# Altium integrated library ALTIUM-PHD_2_54_DUAL_SOCKET_HEADER_6130XX21821.IntLib: 198 symbols (part 2 of 2)
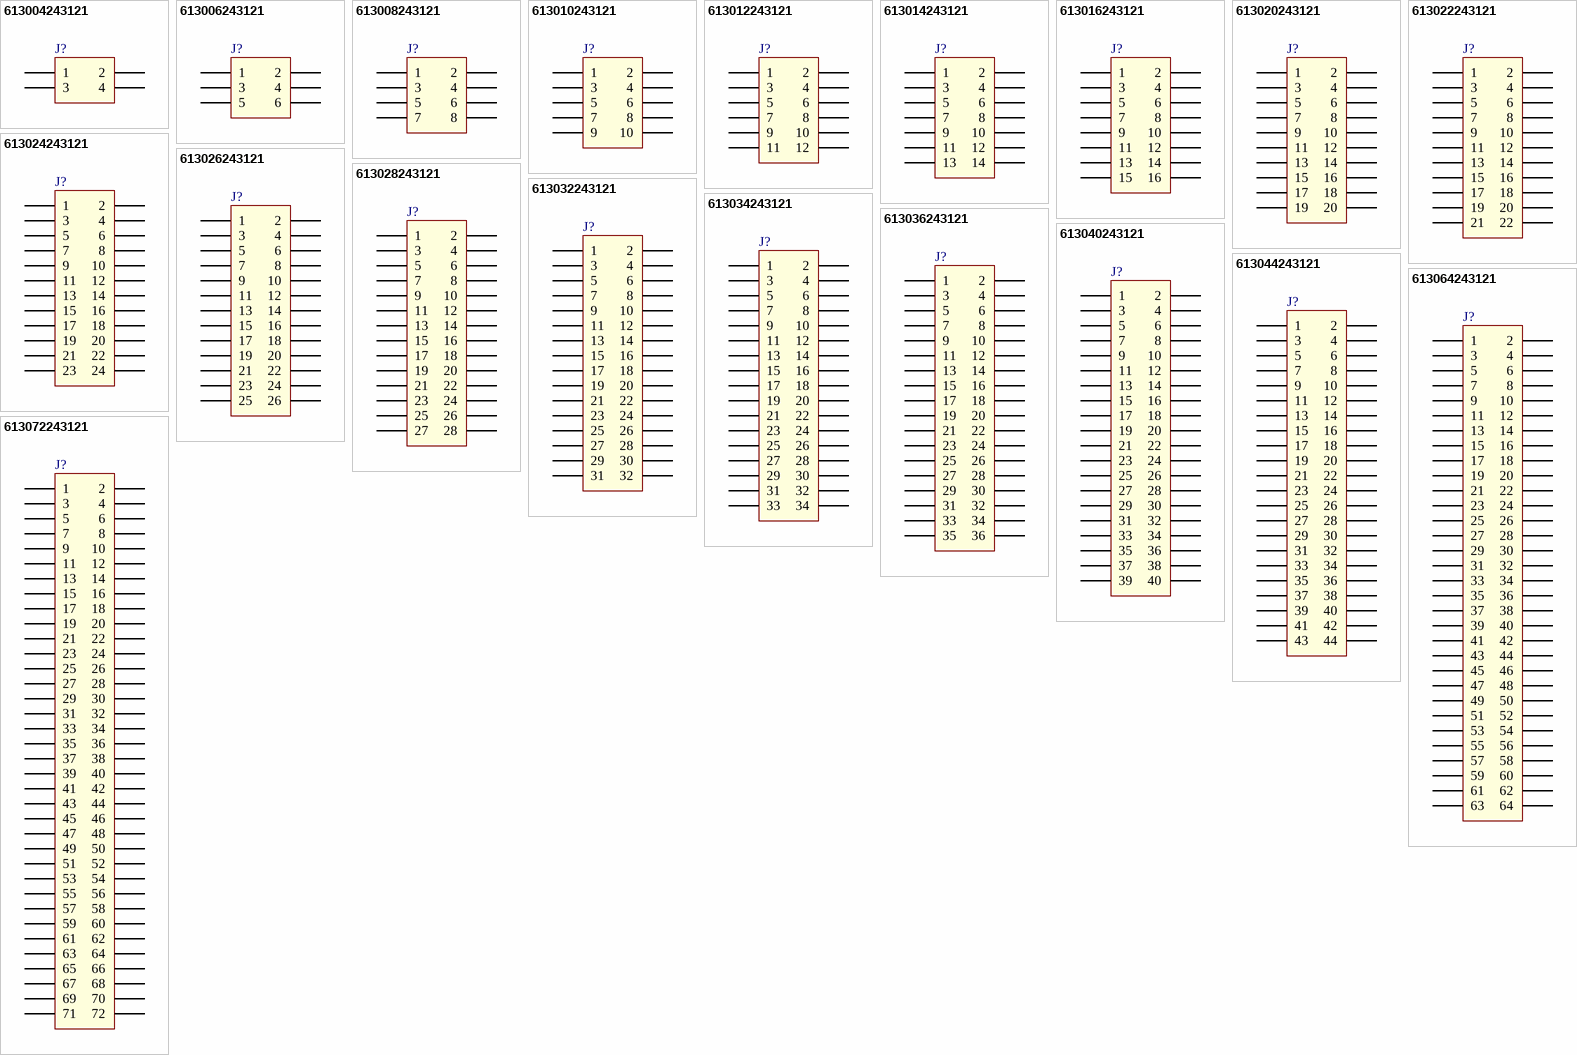
[diagram p14: symbols 613004243121 to 613072243121]

## 613006243121
designator J?
WR-PHD 2.54 mm Angled Dual Socket Header, 6p; Part Number: 613006243121; Pin Number: 6; Rated Current: 3A; Working Voltage: 250V AC; Withstanding Voltage: 500V AC; Pitch: 2.54mm; ComponentLink1Description: Manufacturer; ComponentLink1URL: http://www.we-online.de; ComponentLink2Description: Datasheet; ComponentLink2URL: http://katalog.we-online.de/em/datasheet/6130xx243121.pdf; Published Date: August 2017; Publisher: Wurth Elektronik
footprint 613006243121
pins: 1, 2, 3, 4, 5, 6

## 613008243121
designator J?
WR-PHD 2.54 mm Angled Dual Socket Header, 8p; Part Number: 613008243121; Pin Number: 8; Rated Current: 3A; Working Voltage: 250V AC; Withstanding Voltage: 500V AC; Pitch: 2.54mm; ComponentLink1Description: Manufacturer; ComponentLink1URL: http://www.we-online.de; ComponentLink2Description: Datasheet; ComponentLink2URL: http://katalog.we-online.de/em/datasheet/6130xx243121.pdf; Published Date: August 2017; Publisher: Wurth Elektronik
footprint 613008243121
pins: 1, 2, 3, 4, 5, 6, 7, 8

## 613010243121
designator J?
WR-PHD 2.54 mm Angled Dual Socket Header, 10p; Part Number: 613010243121; Pin Number: 10; Rated Current: 3A; Working Voltage: 250V AC; Withstanding Voltage: 500V AC; Pitch: 2.54mm; ComponentLink1Description: Manufacturer; ComponentLink1URL: http://www.we-online.de; ComponentLink2Description: Datasheet; ComponentLink2URL: http://katalog.we-online.de/em/datasheet/6130xx243121.pdf; Published Date: August 2017; Publisher: Wurth Elektronik
footprint 613010243121
pins: 1, 2, 3, 4, 5, 6, 7, 8, 9, 10

## 613012243121
designator J?
WR-PHD 2.54 mm Angled Dual Socket Header, 12p; Part Number: 613012243121; Pin Number: 12; Rated Current: 3A; Working Voltage: 250V AC; Withstanding Voltage: 500V AC; Pitch: 2.54mm; ComponentLink1Description: Manufacturer; ComponentLink1URL: http://www.we-online.de; ComponentLink2Description: Datasheet; ComponentLink2URL: http://katalog.we-online.de/em/datasheet/6130xx243121.pdf; Published Date: August 2017; Publisher: Wurth Elektronik
footprint 613012243121
pins: 1, 2, 3, 4, 5, 6, 7, 8, 9, 10, 11, 12

## 613014243121
designator J?
WR-PHD 2.54 mm Angled Dual Socket Header, 14p; Part Number: 613014243121; Pin Number: 14; Rated Current: 3A; Working Voltage: 250V AC; Withstanding Voltage: 500V AC; Pitch: 2.54mm; ComponentLink1Description: Manufacturer; ComponentLink1URL: http://www.we-online.de; ComponentLink2Description: Datasheet; ComponentLink2URL: http://katalog.we-online.de/em/datasheet/6130xx243121.pdf; Published Date: August 2017; Publisher: Wurth Elektronik
footprint 613014243121
pins: 1, 2, 3, 4, 5, 6, 7, 8, 9, 10, 11, 12, 13, 14

## 613016243121
designator J?
WR-PHD 2.54 mm Angled Dual Socket Header, 16p; Part Number: 613016243121; Pin Number: 16; Rated Current: 3A; Working Voltage: 250V AC; Withstanding Voltage: 500V AC; Pitch: 2.54mm; ComponentLink1Description: Manufacturer; ComponentLink1URL: http://www.we-online.de; ComponentLink2Description: Datasheet; ComponentLink2URL: http://katalog.we-online.de/em/datasheet/6130xx243121.pdf; Published Date: August 2017; Publisher: Wurth Elektronik
footprint 613016243121
pins: 1, 2, 3, 4, 5, 6, 7, 8, 9, 10, 11, 12, 13, 14, 15, 16

## 613020243121
designator J?
WR-PHD 2.54 mm Angled Dual Socket Header, 20p; Part Number: 613020243121; Pin Number: 20; Rated Current: 3A; Working Voltage: 250V AC; Withstanding Voltage: 500V AC; Pitch: 2.54mm; ComponentLink1Description: Manufacturer; ComponentLink1URL: http://www.we-online.de; ComponentLink2Description: Datasheet; ComponentLink2URL: http://katalog.we-online.de/em/datasheet/6130xx243121.pdf; Published Date: August 2017; Publisher: Wurth Elektronik
footprint 613020243121
pins: 1, 2, 3, 4, 5, 6, 7, 8, 9, 10, 11, 12, 13, 14, 15, 16, 17, 18, 19, 20

## 613022243121
designator J?
WR-PHD 2.54 mm Angled Dual Socket Header, 22p; Part Number: 613022243121; Pin Number: 22; Rated Current: 3A; Working Voltage: 250V AC; Withstanding Voltage: 500V AC; Pitch: 2.54mm; ComponentLink1Description: Manufacturer; ComponentLink1URL: http://www.we-online.de; ComponentLink2Description: Datasheet; ComponentLink2URL: http://katalog.we-online.de/em/datasheet/6130xx243121.pdf; Published Date: August 2017; Publisher: Wurth Elektronik
footprint 613022243121
pins: 1, 2, 3, 4, 5, 6, 7, 8, 9, 10, 11, 12, 13, 14, 15, 16, 17, 18, 19, 20, 21, 22

## 613024243121
designator J?
WR-PHD 2.54 mm Angled Dual Socket Header, 24p; Part Number: 613024243121; Pin Number: 24; Rated Current: 3A; Working Voltage: 250V AC; Withstanding Voltage: 500V AC; Pitch: 2.54mm; ComponentLink1Description: Manufacturer; ComponentLink1URL: http://www.we-online.de; ComponentLink2Description: Datasheet; ComponentLink2URL: http://katalog.we-online.de/em/datasheet/6130xx243121.pdf; Published Date: August 2017; Publisher: Wurth Elektronik
footprint 613024243121
pins: 1, 2, 3, 4, 5, 6, 7, 8, 9, 10, 11, 12, 13, 14, 15, 16, 17, 18, 19, 20, 21, 22, 23, 24

## 613026243121
designator J?
WR-PHD 2.54 mm Angled Dual Socket Header, 26p; Part Number: 613026243121; Pin Number: 26; Rated Current: 3A; Working Voltage: 250V AC; Withstanding Voltage: 500V AC; Pitch: 2.54mm; ComponentLink1Description: Manufacturer; ComponentLink1URL: http://www.we-online.de; ComponentLink2Description: Datasheet; ComponentLink2URL: http://katalog.we-online.de/em/datasheet/6130xx243121.pdf; Published Date: August 2017; Publisher: Wurth Elektronik
footprint 613026243121
pins: 1, 2, 3, 4, 5, 6, 7, 8, 9, 10, 11, 12, 13, 14, 15, 16, 17, 18, 19, 20, 21, 22, 23, 24, 25, 26

## 613028243121
designator J?
WR-PHD 2.54 mm Angled Dual Socket Header, 28p; Part Number: 613028243121; Pin Number: 28; Rated Current: 3A; Working Voltage: 250V AC; Withstanding Voltage: 500V AC; Pitch: 2.54mm; ComponentLink1Description: Manufacturer; ComponentLink1URL: http://www.we-online.de; ComponentLink2Description: Datasheet; ComponentLink2URL: http://katalog.we-online.de/em/datasheet/6130xx243121.pdf; Published Date: August 2017; Publisher: Wurth Elektronik
footprint 613028243121
pins: 1, 2, 3, 4, 5, 6, 7, 8, 9, 10, 11, 12, 13, 14, 15, 16, 17, 18, 19, 20, 21, 22, 23, 24, 25, 26, 27, 28

## 613032243121
designator J?
WR-PHD 2.54 mm Angled Dual Socket Header, 32p; Part Number: 613032243121; Pin Number: 32; Rated Current: 3A; Working Voltage: 250V AC; Withstanding Voltage: 500V AC; Pitch: 2.54mm; ComponentLink1Description: Manufacturer; ComponentLink1URL: http://www.we-online.de; ComponentLink2Description: Datasheet; ComponentLink2URL: http://katalog.we-online.de/em/datasheet/6130xx243121.pdf; Published Date: August 2017; Publisher: Wurth Elektronik
footprint 613032243121
pins: 1, 2, 3, 4, 5, 6, 7, 8, 9, 10, 11, 12, 13, 14, 15, 16, 17, 18, 19, 20, 21, 22, 23, 24, 25, 26, 27, 28, 29, 30, 31, 32

## 613034243121
designator J?
WR-PHD 2.54 mm Angled Dual Socket Header, 34p; Part Number: 613034243121; Pin Number: 34; Rated Current: 3A; Working Voltage: 250V AC; Withstanding Voltage: 500V AC; Pitch: 2.54mm; ComponentLink1Description: Manufacturer; ComponentLink1URL: http://www.we-online.de; ComponentLink2Description: Datasheet; ComponentLink2URL: http://katalog.we-online.de/em/datasheet/6130xx243121.pdf; Published Date: August 2017; Publisher: Wurth Elektronik
footprint 613034243121
pins: 1, 2, 3, 4, 5, 6, 7, 8, 9, 10, 11, 12, 13, 14, 15, 16, 17, 18, 19, 20, 21, 22, 23, 24, 25, 26, 27, 28, 29, 30, 31, 32, 33, 34

## 613036243121
designator J?
WR-PHD 2.54 mm Angled Dual Socket Header, 36p; Part Number: 613036243121; Pin Number: 36; Rated Current: 3A; Working Voltage: 250V AC; Withstanding Voltage: 500V AC; Pitch: 2.54mm; ComponentLink1Description: Manufacturer; ComponentLink1URL: http://www.we-online.de; ComponentLink2Description: Datasheet; ComponentLink2URL: http://katalog.we-online.de/em/datasheet/6130xx243121.pdf; Published Date: August 2017; Publisher: Wurth Elektronik
footprint 613036243121
pins: 1, 2, 3, 4, 5, 6, 7, 8, 9, 10, 11, 12, 13, 14, 15, 16, 17, 18, 19, 20, 21, 22, 23, 24, 25, 26, 27, 28, 29, 30, 31, 32, 33, 34, 35, 36

## 613040243121
designator J?
WR-PHD 2.54 mm Angled Dual Socket Header, 40p; Part Number: 613040243121; Pin Number: 40; Rated Current: 3A; Working Voltage: 250V AC; Withstanding Voltage: 500V AC; Pitch: 2.54mm; ComponentLink1Description: Manufacturer; ComponentLink1URL: http://www.we-online.de; ComponentLink2Description: Datasheet; ComponentLink2URL: http://katalog.we-online.de/em/datasheet/6130xx243121.pdf; Published Date: August 2017; Publisher: Wurth Elektronik
footprint 613040243121
pins: 1, 2, 3, 4, 5, 6, 7, 8, 9, 10, 11, 12, 13, 14, 15, 16, 17, 18, 19, 20, 21, 22, 23, 24, 25, 26, 27, 28, 29, 30, 31, 32, 33, 34, 35, 36, 37, 38, 39, 40

## 613044243121
designator J?
WR-PHD 2.54 mm Angled Dual Socket Header, 44p; Part Number: 613044243121; Pin Number: 44; Rated Current: 3A; Working Voltage: 250V AC; Withstanding Voltage: 500V AC; Pitch: 2.54mm; ComponentLink1Description: Manufacturer; ComponentLink1URL: http://www.we-online.de; ComponentLink2Description: Datasheet; ComponentLink2URL: http://katalog.we-online.de/em/datasheet/6130xx243121.pdf; Published Date: August 2017; Publisher: Wurth Elektronik
footprint 613044243121
pins: 1, 2, 3, 4, 5, 6, 7, 8, 9, 10, 11, 12, 13, 14, 15, 16, 17, 18, 19, 20, 21, 22, 23, 24, 25, 26, 27, 28, 29, 30, 31, 32, 33, 34, 35, 36, 37, 38, 39, 40, 41, 42, 43, 44

## 613064243121
designator J?
WR-PHD 2.54 mm Angled Dual Socket Header, 64p; Part Number: 613064243121; Pin Number: 64; Rated Current: 3A; Working Voltage: 250V AC; Withstanding Voltage: 500V AC; Pitch: 2.54mm; ComponentLink1Description: Manufacturer; ComponentLink1URL: http://www.we-online.de; ComponentLink2Description: Datasheet; ComponentLink2URL: http://katalog.we-online.de/em/datasheet/6130xx243121.pdf; Published Date: August 2017; Publisher: Wurth Elektronik
footprint 613064243121
pins: 1, 2, 3, 4, 5, 6, 7, 8, 9, 10, 11, 12, 13, 14, 15, 16, 17, 18, 19, 20, 21, 22, 23, 24, 25, 26, 27, 28, 29, 30, 31, 32, 33, 34, 35, 36, 37, 38, 39, 40, 41, 42, 43, 44, 45, 46, 47, 48, 49, 50, 51, 52, 53, 54, 55, 56, 57, 58, 59, 60, 61, 62, 63, 64

## 613072243121
designator J?
WR-PHD 2.54 mm Angled Dual Socket Header, 72p; Part Number: 613072243121; Pin Number: 72; Rated Current: 3A; Working Voltage: 250V AC; Withstanding Voltage: 500V AC; Pitch: 2.54mm; ComponentLink1Description: Manufacturer; ComponentLink1URL: http://www.we-online.de; ComponentLink2Description: Datasheet; ComponentLink2URL: http://katalog.we-online.de/em/datasheet/6130xx243121.pdf; Published Date: August 2017; Publisher: Wurth Elektronik
footprint 613072243121
pins: 1, 2, 3, 4, 5, 6, 7, 8, 9, 10, 11, 12, 13, 14, 15, 16, 17, 18, 19, 20, 21, 22, 23, 24, 25, 26, 27, 28, 29, 30, 31, 32, 33, 34, 35, 36, 37, 38, 39, 40, 41, 42, 43, 44, 45, 46, 47, 48, 49, 50, 51, 52, 53, 54, 55, 56, 57, 58, 59, 60, 61, 62, 63, 64, 65, 66, 67, 68, 69, 70, 71, 72


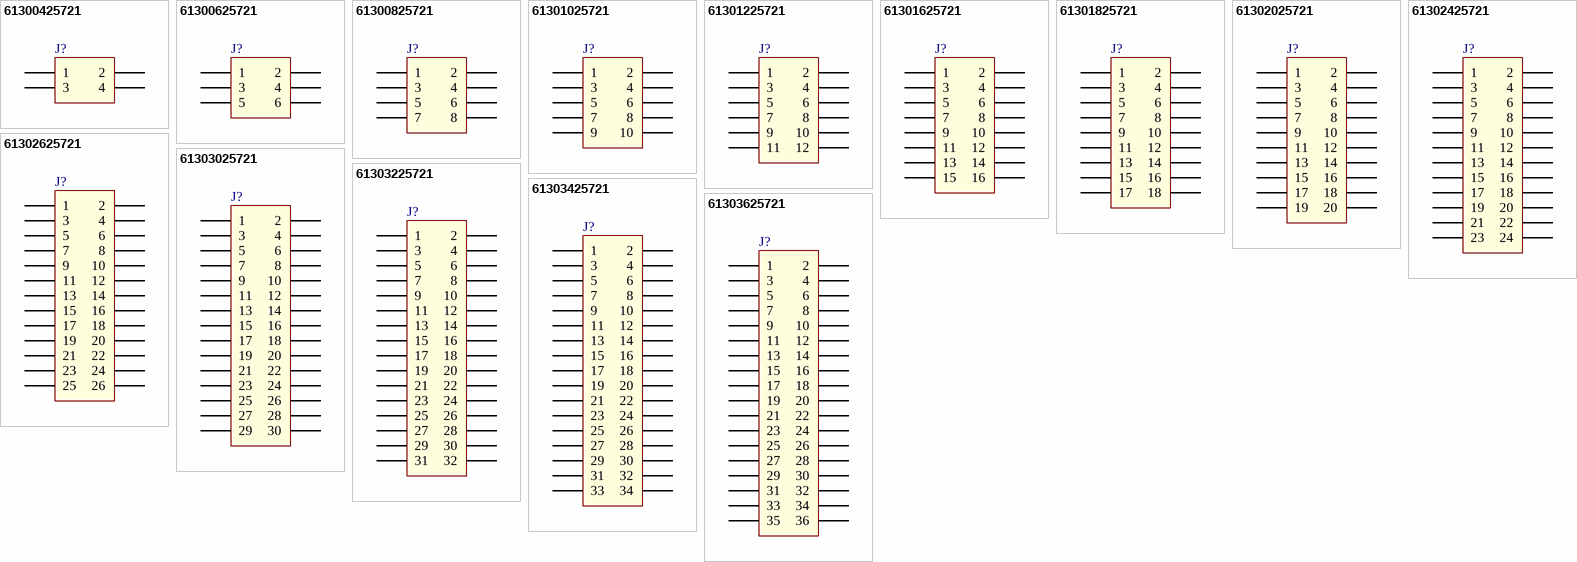
[diagram p13: symbols 61300425721 to 61303625721]

## 61300425721
designator J?
WR-PHD 2.54 mm Dual Socket Header Bottom Entry, 4p; Part Number: 61300425721; Pin Number: 4; Rated Current: 3A; Working Voltage: 250V AC; Withstanding Voltage: 500V AC; Pitch: 2.54mm; ComponentLink1Description: Manufacturer; ComponentLink1URL: http://www.we-online.de; ComponentLink2Description: Datasheet; ComponentLink2URL: http://katalog.we-online.de/em/datasheet/6130xx25721.pdf; Published Date: August 2017; Publisher: Wurth Elektronik
footprint 61300425721
pins: 1, 2, 3, 4

## 61300625721
designator J?
WR-PHD 2.54 mm Dual Socket Header Bottom Entry, 6p; Part Number: 61300625721; Pin Number: 6; Rated Current: 3A; Working Voltage: 250V AC; Withstanding Voltage: 500V AC; Pitch: 2.54mm; ComponentLink1Description: Manufacturer; ComponentLink1URL: http://www.we-online.de; ComponentLink2Description: Datasheet; ComponentLink2URL: http://katalog.we-online.de/em/datasheet/6130xx25721.pdf; Published Date: August 2017; Publisher: Wurth Elektronik
footprint 61300625721
pins: 1, 2, 3, 4, 5, 6

## 61300825721
designator J?
WR-PHD 2.54 mm Dual Socket Header Bottom Entry, 8p; Part Number: 61300825721; Pin Number: 8; Rated Current: 3A; Working Voltage: 250V AC; Withstanding Voltage: 500V AC; Pitch: 2.54mm; ComponentLink1Description: Manufacturer; ComponentLink1URL: http://www.we-online.de; ComponentLink2Description: Datasheet; ComponentLink2URL: http://katalog.we-online.de/em/datasheet/6130xx25721.pdf; Published Date: August 2017; Publisher: Wurth Elektronik
footprint 61300825721
pins: 1, 2, 3, 4, 5, 6, 7, 8

## 61301025721
designator J?
WR-PHD 2.54 mm Dual Socket Header Bottom Entry, 10p; Part Number: 61301025721; Pin Number: 10; Rated Current: 3A; Working Voltage: 250V AC; Withstanding Voltage: 500V AC; Pitch: 2.54mm; ComponentLink1Description: Manufacturer; ComponentLink1URL: http://www.we-online.de; ComponentLink2Description: Datasheet; ComponentLink2URL: http://katalog.we-online.de/em/datasheet/6130xx25721.pdf; Published Date: August 2017; Publisher: Wurth Elektronik
footprint 61301025721
pins: 1, 2, 3, 4, 5, 6, 7, 8, 9, 10

## 61301225721
designator J?
WR-PHD 2.54 mm Dual Socket Header Bottom Entry, 12p; Part Number: 61301225721; Pin Number: 12; Rated Current: 3A; Working Voltage: 250V AC; Withstanding Voltage: 500V AC; Pitch: 2.54mm; ComponentLink1Description: Manufacturer; ComponentLink1URL: http://www.we-online.de; ComponentLink2Description: Datasheet; ComponentLink2URL: http://katalog.we-online.de/em/datasheet/6130xx25721.pdf; Published Date: August 2017; Publisher: Wurth Elektronik
footprint 61301225721
pins: 1, 2, 3, 4, 5, 6, 7, 8, 9, 10, 11, 12

## 61301625721
designator J?
WR-PHD 2.54 mm Dual Socket Header Bottom Entry, 16p; Part Number: 61301625721; Pin Number: 16; Rated Current: 3A; Working Voltage: 250V AC; Withstanding Voltage: 500V AC; Pitch: 2.54mm; ComponentLink1Description: Manufacturer; ComponentLink1URL: http://www.we-online.de; ComponentLink2Description: Datasheet; ComponentLink2URL: http://katalog.we-online.de/em/datasheet/6130xx25721.pdf; Published Date: August 2017; Publisher: Wurth Elektronik
footprint 61301625721
pins: 1, 2, 3, 4, 5, 6, 7, 8, 9, 10, 11, 12, 13, 14, 15, 16

## 61301825721
designator J?
WR-PHD 2.54 mm Dual Socket Header Bottom Entry, 18p; Part Number: 61301825721; Pin Number: 18; Rated Current: 3A; Working Voltage: 250V AC; Withstanding Voltage: 500V AC; Pitch: 2.54mm; ComponentLink1Description: Manufacturer; ComponentLink1URL: http://www.we-online.de; ComponentLink2Description: Datasheet; ComponentLink2URL: http://katalog.we-online.de/em/datasheet/6130xx25721.pdf; Published Date: August 2017; Publisher: Wurth Elektronik
footprint 61301825721
pins: 1, 2, 3, 4, 5, 6, 7, 8, 9, 10, 11, 12, 13, 14, 15, 16, 17, 18

## 61302025721
designator J?
WR-PHD 2.54 mm Dual Socket Header Bottom Entry, 20p; Part Number: 61302025721; Pin Number: 20; Rated Current: 3A; Working Voltage: 250V AC; Withstanding Voltage: 500V AC; Pitch: 2.54mm; ComponentLink1Description: Manufacturer; ComponentLink1URL: http://www.we-online.de; ComponentLink2Description: Datasheet; ComponentLink2URL: http://katalog.we-online.de/em/datasheet/6130xx25721.pdf; Published Date: August 2017; Publisher: Wurth Elektronik
footprint 61302025721
pins: 1, 2, 3, 4, 5, 6, 7, 8, 9, 10, 11, 12, 13, 14, 15, 16, 17, 18, 19, 20

## 61302425721
designator J?
WR-PHD 2.54 mm Dual Socket Header Bottom Entry, 24p; Part Number: 61302425721; Pin Number: 24; Rated Current: 3A; Working Voltage: 250V AC; Withstanding Voltage: 500V AC; Pitch: 2.54mm; ComponentLink1Description: Manufacturer; ComponentLink1URL: http://www.we-online.de; ComponentLink2Description: Datasheet; ComponentLink2URL: http://katalog.we-online.de/em/datasheet/6130xx25721.pdf; Published Date: August 2017; Publisher: Wurth Elektronik
footprint 61302425721
pins: 1, 2, 3, 4, 5, 6, 7, 8, 9, 10, 11, 12, 13, 14, 15, 16, 17, 18, 19, 20, 21, 22, 23, 24

## 61302625721
designator J?
WR-PHD 2.54 mm Dual Socket Header Bottom Entry, 26p; Part Number: 61302625721; Pin Number: 26; Rated Current: 3A; Working Voltage: 250V AC; Withstanding Voltage: 500V AC; Pitch: 2.54mm; ComponentLink1Description: Manufacturer; ComponentLink1URL: http://www.we-online.de; ComponentLink2Description: Datasheet; ComponentLink2URL: http://katalog.we-online.de/em/datasheet/6130xx25721.pdf; Published Date: August 2017; Publisher: Wurth Elektronik
footprint 61302625721
pins: 1, 2, 3, 4, 5, 6, 7, 8, 9, 10, 11, 12, 13, 14, 15, 16, 17, 18, 19, 20, 21, 22, 23, 24, 25, 26

## 61303025721
designator J?
WR-PHD 2.54 mm Dual Socket Header Bottom Entry, 30p; Part Number: 61303025721; Pin Number: 30; Rated Current: 3A; Working Voltage: 250V AC; Withstanding Voltage: 500V AC; Pitch: 2.54mm; ComponentLink1Description: Manufacturer; ComponentLink1URL: http://www.we-online.de; ComponentLink2Description: Datasheet; ComponentLink2URL: http://katalog.we-online.de/em/datasheet/6130xx25721.pdf; Published Date: August 2017; Publisher: Wurth Elektronik
footprint 61303025721
pins: 1, 2, 3, 4, 5, 6, 7, 8, 9, 10, 11, 12, 13, 14, 15, 16, 17, 18, 19, 20, 21, 22, 23, 24, 25, 26, 27, 28, 29, 30

## 61303225721
designator J?
WR-PHD 2.54 mm Dual Socket Header Bottom Entry, 32p; Part Number: 61303225721; Pin Number: 32; Rated Current: 3A; Working Voltage: 250V AC; Withstanding Voltage: 500V AC; Pitch: 2.54mm; ComponentLink1Description: Manufacturer; ComponentLink1URL: http://www.we-online.de; ComponentLink2Description: Datasheet; ComponentLink2URL: http://katalog.we-online.de/em/datasheet/6130xx25721.pdf; Published Date: August 2017; Publisher: Wurth Elektronik
footprint 61303225721
pins: 1, 2, 3, 4, 5, 6, 7, 8, 9, 10, 11, 12, 13, 14, 15, 16, 17, 18, 19, 20, 21, 22, 23, 24, 25, 26, 27, 28, 29, 30, 31, 32

## 61303425721
designator J?
WR-PHD 2.54 mm Dual Socket Header Bottom Entry, 34p; Part Number: 61303425721; Pin Number: 34; Rated Current: 3A; Working Voltage: 250V AC; Withstanding Voltage: 500V AC; Pitch: 2.54mm; ComponentLink1Description: Manufacturer; ComponentLink1URL: http://www.we-online.de; ComponentLink2Description: Datasheet; ComponentLink2URL: http://katalog.we-online.de/em/datasheet/6130xx25721.pdf; Published Date: August 2017; Publisher: Wurth Elektronik
footprint 61303425721
pins: 1, 2, 3, 4, 5, 6, 7, 8, 9, 10, 11, 12, 13, 14, 15, 16, 17, 18, 19, 20, 21, 22, 23, 24, 25, 26, 27, 28, 29, 30, 31, 32, 33, 34

## 61303625721
designator J?
WR-PHD 2.54 mm Dual Socket Header Bottom Entry, 36p; Part Number: 61303625721; Pin Number: 36; Rated Current: 3A; Working Voltage: 250V AC; Withstanding Voltage: 500V AC; Pitch: 2.54mm; ComponentLink1Description: Manufacturer; ComponentLink1URL: http://www.we-online.de; ComponentLink2Description: Datasheet; ComponentLink2URL: http://katalog.we-online.de/em/datasheet/6130xx25721.pdf; Published Date: August 2017; Publisher: Wurth Elektronik
footprint 61303625721
pins: 1, 2, 3, 4, 5, 6, 7, 8, 9, 10, 11, 12, 13, 14, 15, 16, 17, 18, 19, 20, 21, 22, 23, 24, 25, 26, 27, 28, 29, 30, 31, 32, 33, 34, 35, 36